# Altium integrated library SFMproject.IntLib: 182 symbols (continued)
## THVD1410DR
designator B?
3.3-V to 5-V RS-485 transceiver with +/-18-kV IEC ESD protection; Manufacturer_Name: Texas Instruments; Geometry.Height: 1.75mm; Mouser Part Number: 595-THVD1410DR; Mouser Price/Stock: https://www.mouser.co.uk/ProductDetail/Texas-Instruments/THVD1410DR?qs=chTDxNqvsylen%252BY7bN3dRQ%3D%3D; Manufacturer_Part_Number: THVD1410DR; Datasheet Link: http://www.ti.com/lit/gpn/THVD1410
footprint SOIC127P600X175-8N
pins: 1 R, 2 ~{RE}, 3 DE, 4 D, 5 GND, 6 A, 7 B, 8 VCC

## TP4056
designator U?
Complete single cell Li-Ion battery with a constant current / constant voltage linear charger; MF: NanJing Top Power ASIC Corp.; MP: TP4056; Check_prices: https://www.snapeda.com/parts/TP4056/NanJing+Top+Power+ASIC+Corp./view-part/?ref=eda; SnapEDA_Link: https://www.snapeda.com/parts/TP4056/NanJing+Top+Power+ASIC+Corp./view-part/?ref=snap; Price: None; Availability: Not in stock; Package: Package; Value: *
footprint SOP127P600X175-9N
pins: 1 TEMP (in), 2 PROG (io), 3 GND (power), 4 VCC (power), 5 BAT (out), 6 ~{STDBY} (out), 7 ~{CHRG} (out), 8 CE (in), 9 EP

## TSOP18338
designator D?  Supplier 1: Arrow Electronics  (hidden comment: TSOP18338)
Infrared Receivers Minicast AGC3 38kHz 2.5-5.5V; Manufacturer_Name: Vishay; Mouser Part Number: 78-TSOP18338; Mouser Price/Stock: https://www.mouser.co.uk/ProductDetail/Vishay-Semiconductors/TSOP1838?qs=xIYnuWu13fNltSDswXyV7w%3D%3D; Manufacturer_Part_Number: TSOP18338; Datasheet Link: *; Supplier Part Number 1: TSOP18338
footprint TSOP4856
pins: 1 OUT, 2 GND, 3 VCC

## UMH3NTN
designator Q?  Supplier 1: Digi-Key  Supplier Part Number 1: UMH3NTNCT-ND
Bipolar Transistors - Pre-Biased DUAL NPN 50V 100MA SOT-363; Manufacturer_Name: ROHM Semiconductor; Geometry.Height: 1mm; Mouser Part Number: 755-UMH3NTN; Mouser Price/Stock: https://www.mouser.co.uk/ProductDetail/ROHM-Semiconductor/UMH3NTN?qs=4kLU8WoGk0st6ahJ6z2bmw%3D%3D; Manufacturer_Part_Number: UMH3NTN; Datasheet Link: https://componentsearchengine.com/Datasheets/2/UMH3NTN.pdf
footprint UMH3NTN
pins: 1 EMITTER_1, 2 BASE_1, 3 COLLECTOR_2, 4 EMITTER_2, 5 BASE_2, 6 COLLECTOR_1

## USB4110-GF-A
designator J?  Supplier 1: Future Electronics  Supplier Part Number 1: 5117339  (hidden comment: USB4110-GF-A)
CONN USB 2.0 TYPE-C R/A SMT; Manufacturer_Name: GCT (GLOBAL CONNECTOR TECHNOLOGY); Geometry.Height: 3.26mm; Mouser Part Number: 640-USB4110-GF-A; Mouser Price/Stock: https://www.mouser.co.uk/ProductDetail/GCT/USB4110-GF-A?qs=KUoIvG%2F9IlYiZvIXQjyJeA%3D%3D; Manufacturer_Part_Number: USB4110-GF-A; Datasheet Link: https://gct.co/files/drawings/usb4110.pdf
footprint USB4110GFA
pins: A1 GND, A4 VBUS, A5 CC1, A6 D1+, A7 D1-, A8 SBU1, A9 VBUS, A12 GND, B1 GND, B4 VBUS, B5 CC2, B6 D2+, B7 D2-, B8 SBU2, B9 VBUS, B12 GND, MP1 GNG, MP2 GND, MP3 GND, MP4 GND

## USB4160-03-0170-C
designator J?
USB Connectors USB-C Rec 3u" Vert 24P SMT 1.7mm TH stakes H7.46mm T+R+Cap; Manufacturer_Name: GCT (GLOBAL CONNECTOR TECHNOLOGY); Geometry.Height: 7.66mm; Mouser Part Number: 640-USB4160-3-0170-C; Mouser Price/Stock: https://www.mouser.co.uk/ProductDetail/GCT/USB4160-03-0170-C?qs=vvQtp7zwQdMCGQNngnxScA%3D%3D; Manufacturer_Part_Number: USB4160-03-0170-C; Datasheet Link: https://gct.co/Files/Drawings/USB4160.pdf?v=75f6cea7-84cd-41d4-89e8-137dc7b10777
footprint USB4160030170C
pins: A1 GND_1, A2 SSTXP1, A3 SSTXN1, A4 VBUS_1, A5 CC1, A6 DP1, A7 DN1, A8 SBU1, A9 VBUS_2, A10 SSRXN2, A11 SSRXP2, A12 GND_2, B1 GND_3, B2 SSTXP2, B3 SSTXN2, B4 VBUS_3, B5 CC2, B6 DP2, B7 DN2, B8 SBU2, B9 VBUS_4, B10 SSRXN1, B11 SSRXP1, B12 GND_4, MH1, MH2, MH5, MH6

## VLS4012HBX-4R7M-N
designator L?
Inductor; Manufacturer_Name: TDK; Manufacturer_Part_Number: VLS4012HBX-4R7M-N; Datasheet Link: https://product.tdk.com/system/files/dam/doc/product/inductor/inductor/smd/catalog/inductor_commercial_power_vls4012hbx_en.pdf; Mouser Part Number: 810-VLS4012HBX4R7M-N; Mouser Price/Stock: https://www.mouser.co.uk/ProductDetail/TDK/VLS4012HBX-4R7M-N?qs=A6eO%252BMLsxmSUMw4Ft0GsxA%3D%3D
footprint VLS4012
pins: 1, 2

## WP115WEYW
designator D?  Supplier 1: Mouser  Supplier Part Number 1: 604-WP115WEYW
LED Bi-Color Hi-Eff. Red/Yellow 627nm/590nm 3-Pin T-1 Bulk; Manufacturer_Name: Kingbright; Geometry.Height: 7.1mm; Mouser Part Number: 604-WP115WEYW; Mouser Price/Stock: https://www.mouser.co.uk/ProductDetail/Kingbright/WP115WEYW?qs=58z0TXQGVSR6wNJCc0QydA%3D%3D; Manufacturer_Part_Number: WP115WEYW; Datasheet Link: http://www.kingbrightusa.com/images/catalog/SPEC/WP115WEYW.pdf
footprint WP115WEYW
pins: 1 A_RED, 2 COMMON_K, 3 A_YELLOW


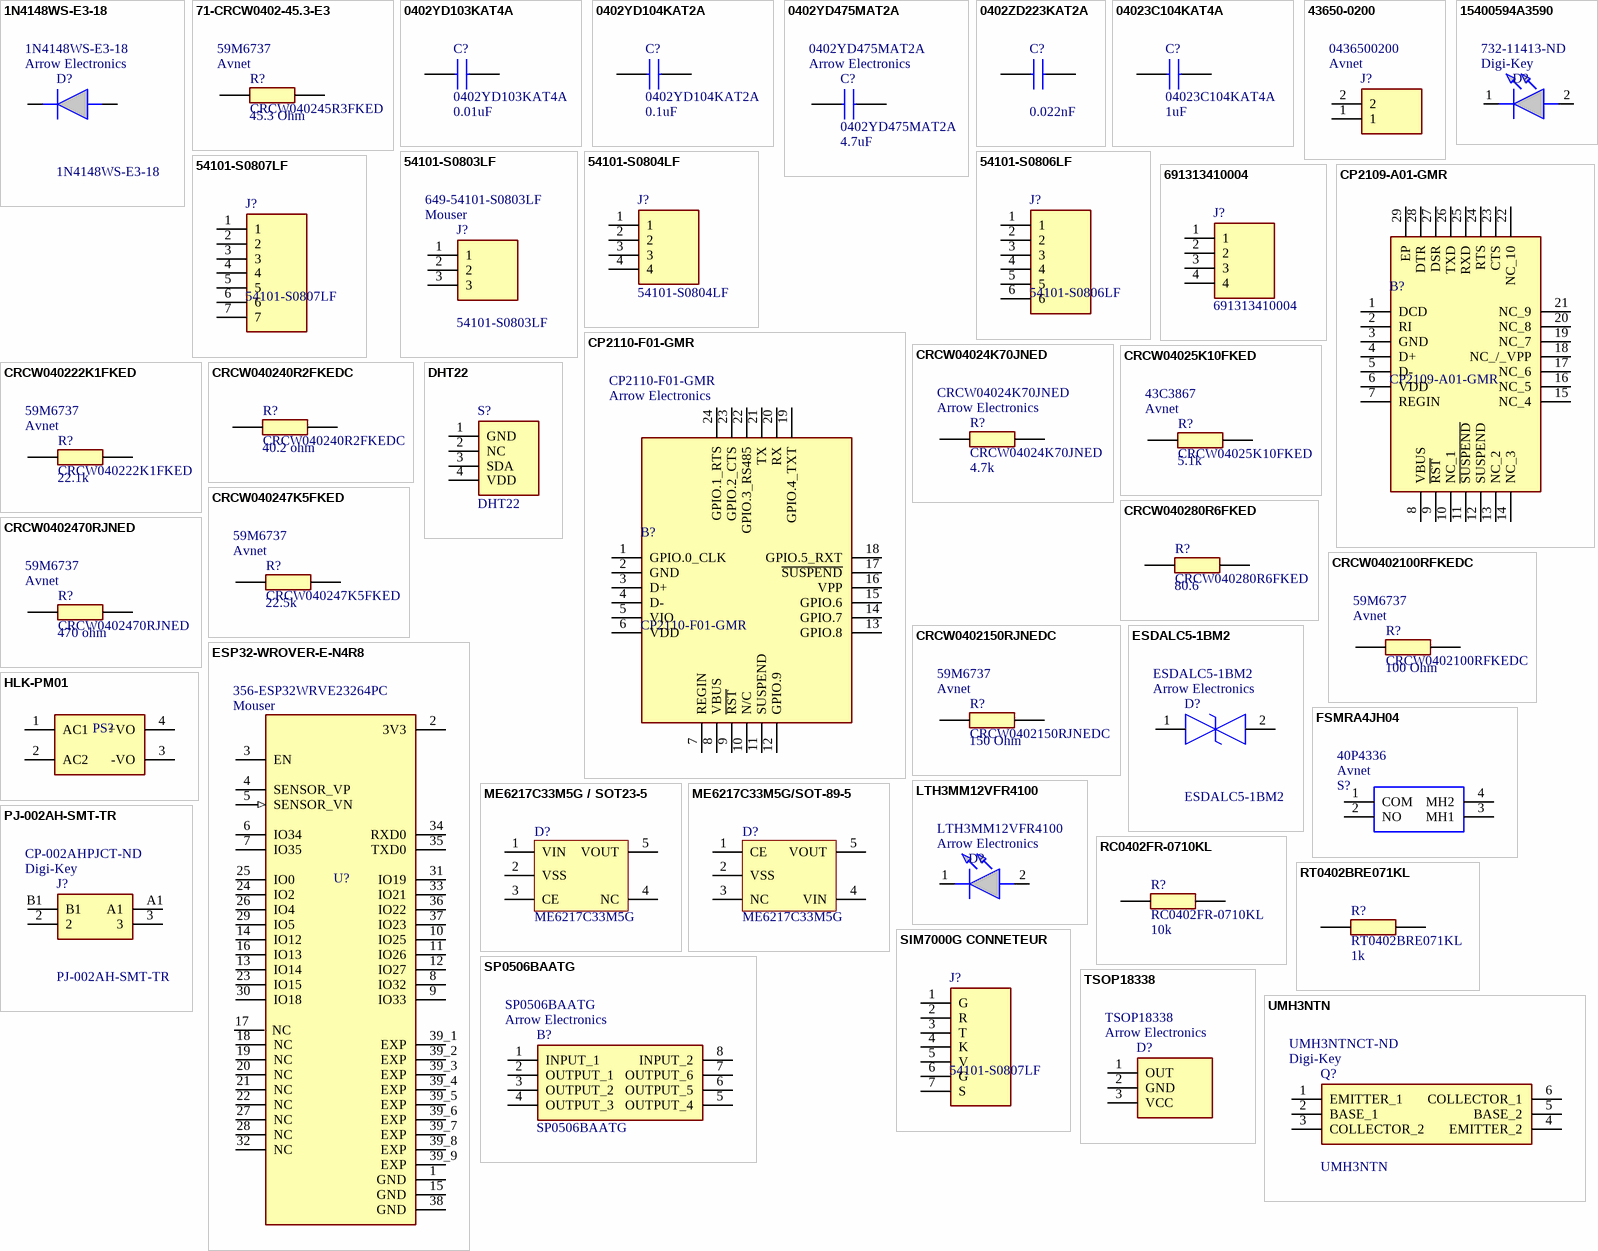
[diagram p5: symbols 1N4148WS-E3-18 to UMH3NTN]

## 1N4148WS-E3-18
designator D?  Supplier 1: Arrow Electronics
VISHAY - 1N4148WS-E3-18 - DIODE, SWITCHING, 150MA, 100V, SOD-323; Geometry.Height: 1.15mm; Mouser Part Number: 78-1N4148WS-E3-18; Mouser Price/Stock: https://www.mouser.co.uk/ProductDetail/Vishay-Semiconductors/1N4148WS-E3-18?qs=bTzheeSci6SMGZleBxLU%2Fg%3D%3D; Manufacturer_Name: Vishay; Manufacturer_Part_Number: 1N4148WS-E3-18; Datasheet Link: https://www.vishay.com/docs/85751/1n4148ws.pdf; Supplier Part Number 1: 1N4148WS-E3-18
footprint SOD2713X115N
pins: 1 K, 2 A

## 71-CRCW0402-45.3-E3
designator R?, comment CRCW040245R3FKED  value 45.3 Ohm  Supplier 1: Avnet  Supplier Part Number 1: 59M6737
Résistances à couches épaisses - CMS 1/16watt 45.3ohms 1%; Manufacturer_Name: Vishay; Geometry.Height: 0.4mm; Mouser Part Number: 71-CRCW0402-45.3-E3; Mouser Price/Stock: https://www.mouser.co.uk/ProductDetail/Vishay-Dale/CRCW04024K70JNED?qs=iWCWVRvNViwY%252BotGHUbALg%3D%3D; Manufacturer_Part_Number: CRCW040245R3FKED; Datasheet Link: http://www.vishay.com/docs/20035/dcrcwe3.pdf
footprint RESC1005X40N
pins: 1, 2

## 0402YD103KAT4A
designator C?  value 0.01uF
Multilayer Ceramic Capacitors MLCC - SMD/SMT 16V 0.01uF X7R 0402 10%; Manufacturer_Name: AVX; Manufacturer_Part_Number: 0402YC103KAT4A; Geometry.Height: 0.56mm; Mouser Part Number: 581-0402YC103KAT4A; Mouser Price/Stock: https://www.mouser.co.uk/ProductDetail/AVX/0402YD104KAT2A?qs=fS3i9m8Z%2FmrV7G1UZb6Y7g%3D%3D; Datasheet Link: *; Supplier Part Number 1: 0402YD104KAT2A; Supplier 1: Avnet
footprint CAPC1005X40N
pins: 1, 2

## 0402YD104KAT2A
designator C?  value 0.1uF
Capacitor MLCC 0402 100nF 16V AVX 0402 Standard 100nF Ceramic Multilayer Capacitor, 16 V dc, +85C, X5R Dielectric, +/-10% SMD; Geometry.Height: 0.56mm; Mouser Part Number: 581-0402YD104K; Mouser Price/Stock: https://www.mouser.co.uk/ProductDetail/AVX/0402YD104KAT2A?qs=fS3i9m8Z%2FmrV7G1UZb6Y7g%3D%3D; Manufacturer_Name: AVX; Manufacturer_Part_Number: 0402YD104KAT2A; Datasheet Link: *; Supplier Part Number 1: 0402YD104KAT2A; Supplier 1: Avnet
footprint CAPC1005X40N
pins: 1, 2

## 0402YD475MAT2A
designator C?  value 4.7uF  Supplier 1: Arrow Electronics
Multilayer Ceramic Capacitors MLCC - SMD/SMT 16V 4.7uF 20% X5R 0402; Manufacturer_Name: AVX; Geometry.Height: 0.71mm; Mouser Part Number: 581-0402YD475MAT2A; Mouser Price/Stock: https://www.mouser.co.uk/ProductDetail/AVX/0402YD475MAT2A?qs=s6nfgz3miVxwCmHE9M6tUg%3D%3D; Manufacturer_Part_Number: 0402YD475MAT2A; Datasheet Link: *; Supplier Part Number 1: 0402YD475MAT2A
footprint CAPC1005X40N
pins: 1, 2

## 0402ZD223KAT2A
designator C?  value 0.022nF  (hidden comment: 0402ZD223KAT2A)
Multilayer Ceramic Capacitors MLCC - SMD/SMT 10V 0.022uF X5R 0402 10%; Manufacturer_Name: AVX; Manufacturer_Part_Number: 0402YD104KAT2A; Geometry.Height: 0.56mm; Mouser Part Number: 581-0402ZD223KAT2A; Mouser Price/Stock: https://www.mouser.co.uk/ProductDetail/AVX/0402YD104KAT2A?qs=fS3i9m8Z%2FmrV7G1UZb6Y7g%3D%3D; Datasheet Link: *; Supplier Part Number 1: 0402YD104KAT2A; Supplier 1: Avnet
footprint CAPC1005X40N
pins: 1, 2

## 04023C104KAT4A
designator C?  value 1uF
Multilayer Ceramic Capacitors MLCC - SMD/SMT 25V .1uF X7R 0402; Manufacturer_Name: AVX; Geometry.Height: 0.56mm; Mouser Part Number: 581-04023C104KAT4A; Mouser Price/Stock: https://www.mouser.co.uk/ProductDetail/AVX/0402YD104KAT2A?qs=fS3i9m8Z%2FmrV7G1UZb6Y7g%3D%3D; Manufacturer_Part_Number: 04023C104KAT4A; Datasheet Link: *; Supplier Part Number 1: 0402YD104KAT2A; Supplier 1: Avnet
footprint CAPC1005X40N
pins: 1, 2

## 43650-0200
designator J?  Supplier 1: Avnet  Supplier Part Number 1: 0436500200  (hidden comment: 43650-0200)
Micro-Fit 3.0 Right-Angle Header, 3.00mm Pitch, Single Row, 2 Circuits, with Snap-in Plastic Peg PCB Lock, Glow-Wire Capable, Black; Manufacturer_Name: Molex; Geometry.Height: 5.57mm; Mouser Part Number: 538-43650-0200; Mouser Price/Stock: https://www.mouser.co.uk/ProductDetail/Molex/43650-0200?qs=HlEFOAM0q6XGaAJJj3Pssw%3D%3D; Manufacturer_Part_Number: 43650-0200; Datasheet Link: https://www.molex.com/pdm_docs/sd/436500200_sd.pdf
footprint 43650-02(00,01,02)
pins: 1, 2

## 54101-S0803LF
designator J?  Supplier 1: Mouser  Supplier Part Number 1: 649-54101-S0803LF
BergStik, Board to Board connector, Unshrouded vertical Header, Through Hole, Single Row, 3 Positions, 2.54 mm Pitch.; Manufacturer_Name: Amphenol Communication Solutions; Geometry.Height: 8.58mm; Mouser Part Number: 649-54101-S0803LF; Mouser Price/Stock: https://www.mouser.co.uk/ProductDetail/Amphenol-FCI/54101-S0803LF?qs=iiM6sTJtPEc921tw16XaKg%3D%3D; Manufacturer_Part_Number: 54101-S0803LF; Datasheet Link: https://cdn.amphenol-cs.com/media/wysiwyg/files/drawing/54101.pdf
footprint 54101S0803LF
pins: 1, 2, 3

## 54101-S0804LF
designator J?
BergStik, Board to Board connector, Unshrouded vertical Header, Through Hole, Single Row, 4 Positions, 2.54 mm Pitch.; Manufacturer_Name: Amphenol Communication Solutions; Geometry.Height: 8.58mm; Mouser Part Number: 649-54101-S0804LF; Mouser Price/Stock: https://www.mouser.co.uk/ProductDetail/Amphenol-FCI/54101-S0803LF?qs=iiM6sTJtPEc921tw16XaKg%3D%3D; Manufacturer_Part_Number: 54101-S0804LF; Datasheet Link: https://cdn.amphenol-cs.com/media/wysiwyg/files/drawing/54101.pdf
footprint 54101S0804LF
pins: 1, 2, 3, 4

## 54101-S0806LF
designator J?
BergStik, Board to Board connector, Unshrouded vertical Header, Through Hole, Single Row, 6 Positions, 2.54 mm Pitch.; Manufacturer_Name: Amphenol Communication Solutions; Geometry.Height: 8.58mm; Mouser Part Number: 649-54101-S0806LF; Mouser Price/Stock: https://www.mouser.co.uk/ProductDetail/Amphenol-FCI/54101-S0803LF?qs=iiM6sTJtPEc921tw16XaKg%3D%3D; Manufacturer_Part_Number: 54101-S0806LF; Datasheet Link: https://cdn.amphenol-cs.com/media/wysiwyg/files/drawing/54101.pdf
footprint 54101S0806LF
pins: 1, 2, 3, 4, 5, 6

## 54101-S0807LF
designator J?
BergStik, Board to Board connector, Unshrouded vertical Header, Through Hole, Single Row, 6 Positions, 2.54 mm Pitch.; Manufacturer_Name: Amphenol Communication Solutions; Geometry.Height: 8.58mm; Mouser Part Number: 649-54101-S0807LF; Mouser Price/Stock: https://www.mouser.co.uk/ProductDetail/Amphenol-FCI/54101-S0803LF?qs=iiM6sTJtPEc921tw16XaKg%3D%3D; Manufacturer_Part_Number: 54101-S0807LF; Datasheet Link: https://cdn.amphenol-cs.com/media/wysiwyg/files/drawing/54101.pdf
footprint 54101S0807LF
pins: 1, 2, 3, 4, 5, 6, 7

## 15400594A3590
designator D?  Supplier 1: Digi-Key  Supplier Part Number 1: 732-11413-ND  (hidden comment: 15400594A3590)
15400594A3590 Wurth Elektronik, WL-TIRW 940nm IR LED, 5 mm Through Hole package; Geometry.Height: 12.1mm; Mouser Part Number: 710-15400594A3590; Mouser Price/Stock: https://www.mouser.co.uk/ProductDetail/Wurth-Elektronik/15400594A3590?qs=5aG0NVq1C4xq5TwbX552tA%3D%3D; Manufacturer_Name: Wurth Elektronik; Manufacturer_Part_Number: 15400594A3590; Datasheet Link: https://www.we-online.com/katalog/datasheet/15400594A3590.pdf
footprint 15400594A3590
pins: 1 K, 2 A

## 691313410004
designator J?
WR-TBL Terminal block - serie 3134; Manufacturer_Name: Wurth Elektronik; Geometry.Height: 8.7mm; Mouser Part Number: 710-691313410004; Mouser Price/Stock: https://www.mouser.co.uk/ProductDetail/Wurth-Elektronik/691313410004?qs=E2PpAYvlWVthY%252BgqnT90lw%3D%3D; Manufacturer_Part_Number: 691313410004; Datasheet Link: *
footprint 691313410004
pins: 1, 2, 3, 4

## CP2109-A01-GMR
designator B?
I/O Controller Interface IC USB to UART Bridge QFN28; Manufacturer_Name: Silicon Labs; Geometry.Height: 1mm; Mouser Part Number: 634-CP2109-A01-GMR; Mouser Price/Stock: https://www.mouser.co.uk/ProductDetail/Silicon-Labs/CP2109-A01-GMR/?qs=Yyy8avaXlIsQmYePmSolcw%3D%3D; Manufacturer_Part_Number: CP2109-A01-GMR; Datasheet Link: https://www.silabs.com/documents/public/data-sheets/CP2102-9.pdf
pins: 1 DCD, 2 RI, 3 GND, 4 D+, 5 D-, 6 VDD, 7 REGIN, 8 VBUS, 9 ~{RST}, 10 NC_1, 11 ~{SUSPEND}, 12 SUSPEND, 13 NC_2, 14 NC_3, 15 NC_4, 16 NC_5, 17 NC_6, 18 NC_/_VPP, 19 NC_7, 20 NC_8, 21 NC_9, 22 NC_10, 23 CTS, 24 RTS, 25 RXD, 26 TXD, 27 DSR, 28 DTR, 29 EP

## CP2110-F01-GMR
designator B?  Supplier 1: Arrow Electronics
SILICON LABS - CP2110-F01-GMR - Interface Bridges, USB to UART, 3 V, 3.6 V, QFN, 24 Pins, -40 C; Geometry.Height: 0.8mm; Mouser Part Number: 634-CP2110-F01-GMR; Mouser Price/Stock: https://www.mouser.co.uk/ProductDetail/Silicon-Labs/CP2110-F01-GMR?qs=1CB38rTTsYoBd%2F8uYjIPcw%3D%3D; Manufacturer_Name: Silicon Labs; Manufacturer_Part_Number: CP2110-F01-GMR; Datasheet Link: https://www.silabs.com/documents/public/data-sheets/CP2110.pdf; Supplier Part Number 1: CP2110-F01-GMR
footprint QFN50P400X400X80-25N-D -2
pins: 1 GPIO.0_CLK, 2 GND, 3 D+, 4 D-, 5 VIO, 6 VDD, 7 REGIN, 8 VBUS, 9 ~{RST}, 10 N/C, 11 SUSPEND, 12 GPIO.9, 13 GPIO.8, 14 GPIO.7, 15 GPIO.6, 16 VPP, 17 ~{SUSPEND}, 18 GPIO.5_RXT, 19 GPIO.4_TXT, 20 RX, 21 TX, 22 GPIO.3_RS485, 23 GPIO.2_CTS, 24 GPIO.1_RTS

## CRCW04024K70JNED
designator R?  value 4.7k  Supplier 1: Arrow Electronics
VISHAY - CRCW04024K70JNED - RES, THICK FILM, 4K7, 5%, 0.063W, 0402; Geometry.Height: 0.4mm; Mouser Part Number: 71-CRCW0402J-4.7K-E3; Mouser Price/Stock: https://www.mouser.co.uk/ProductDetail/Vishay-Dale/CRCW04024K70JNED?qs=iWCWVRvNViwY%252BotGHUbALg%3D%3D; Manufacturer_Name: Vishay; Manufacturer_Part_Number: CRCW04024K70JNED; Datasheet Link: http://www.vishay.com/docs/20035/dcrcwe3.pdf; Supplier Part Number 1: CRCW04024K70JNED
footprint RESC1005X40N
pins: 1, 2

## CRCW04025K10FKED
designator R?  value 5.1k  Supplier 1: Avnet  Supplier Part Number 1: 43C3867
Thick Film Resistors - SMD 3/4watt 5.1Kohms 5%; Manufacturer_Name: Vishay; Geometry.Height: 0.4mm; Mouser Part Number: 71-CRCW0402-5.1K-E3; Mouser Price/Stock: https://www.mouser.co.uk/ProductDetail/Vishay-Dale/CRCW04024K70JNED?qs=iWCWVRvNViwY%252BotGHUbALg%3D%3D; Manufacturer_Part_Number: CRCW04025K10FKED; Datasheet Link: http://www.vishay.com/docs/20035/dcrcwe3.pdf
footprint RESC1005X40N
pins: 1, 2

## CRCW040222K1FKED
designator R?  value 22.1k  Supplier 1: Avnet  Supplier Part Number 1: 59M6737
Résistances à couches épaisses - CMS 1/16watt 22.1Kohms 1%; Manufacturer_Name: Vishay; Geometry.Height: 0.4mm; Mouser Part Number: 71-CRCW0402-22.1K-E3; Mouser Price/Stock: https://www.mouser.co.uk/ProductDetail/Vishay-Dale/CRCW04024K70JNED?qs=iWCWVRvNViwY%252BotGHUbALg%3D%3D; Manufacturer_Part_Number: CRCW040222K1FKED; Datasheet Link: http://www.vishay.com/docs/20035/dcrcwe3.pdf
footprint RESC1005X40N
pins: 1, 2

## CRCW040240R2FKEDC
designator R?  value 40.2 ohm
Résistances à couches épaisses - CMS 1/16watt 40.2ohms 1% Commercial Use; Manufacturer_Name: Vishay; Geometry.Height: 0.4mm; Mouser Part Number: 71-CRCW040240R2FKEDC; Mouser Price/Stock: https://www.mouser.co.uk/ProductDetail/Vishay-Dale/CRCW04024K70JNED?qs=iWCWVRvNViwY%252BotGHUbALg%3D%3D; Manufacturer_Part_Number: CRCW040240R2FKEDC; Datasheet Link: http://www.vishay.com/docs/20035/dcrcwe3.pdf; Supplier 1: Avnet; Supplier Part Number 1: 59M6737
footprint RESC1005X40N
pins: 1, 2

## CRCW040247K5FKED
designator R?  value 22.5k  Supplier 1: Avnet  Supplier Part Number 1: 59M6737
Résistances à couches épaisses - CMS 1/16watt 47.5Kohms 1%; Manufacturer_Name: Vishay; Geometry.Height: 0.4mm; Mouser Part Number: 71-CRCW0402-47.5K-E3; Mouser Price/Stock: https://www.mouser.co.uk/ProductDetail/Vishay-Dale/CRCW04024K70JNED?qs=iWCWVRvNViwY%252BotGHUbALg%3D%3D; Manufacturer_Part_Number: CRCW040247K5FKED; Datasheet Link: http://www.vishay.com/docs/20035/dcrcwe3.pdf
footprint RESC1005X40N
pins: 1, 2

## CRCW040280R6FKED
designator R?  value 80.6
Résistances à couches épaisses - CMS 1/16watt 80.6ohms 1%; Manufacturer_Name: Vishay; Geometry.Height: 0.4mm; Mouser Part Number: 71-CRCW0402-80.6-E3; Mouser Price/Stock: https://www.mouser.co.uk/ProductDetail/Vishay-Dale/CRCW04024K70JNED?qs=iWCWVRvNViwY%252BotGHUbALg%3D%3D; Manufacturer_Part_Number: CRCW040280R6FKED; Datasheet Link: http://www.vishay.com/docs/20035/dcrcwe3.pdf; Supplier 1: Avnet; Supplier Part Number 1: 59M6737
footprint RESC1005X40N
pins: 1, 2

## CRCW0402100RFKEDC
designator R?  value 100 Ohm  Supplier 1: Avnet  Supplier Part Number 1: 59M6737
Résistances à couches épaisses - CMS 1/16watt 100ohms 1% Commercial Use; Manufacturer_Name: Vishay; Geometry.Height: 0.4mm; Mouser Part Number: 71-CRCW0402100RFKEDC; Mouser Price/Stock: https://www.mouser.co.uk/ProductDetail/Vishay-Dale/CRCW04024K70JNED?qs=iWCWVRvNViwY%252BotGHUbALg%3D%3D; Manufacturer_Part_Number: CRCW0402100RFKEDC; Datasheet Link: http://www.vishay.com/docs/20035/dcrcwe3.pdf
footprint RESC1005X40N
pins: 1, 2

## CRCW0402150RJNEDC
designator R?  value 150 Ohm  Supplier 1: Avnet  Supplier Part Number 1: 59M6737
Thick Film Resistors - SMD 1/16watt 150ohms 5%; Manufacturer_Name: Vishay; Geometry.Height: 0.4mm; Mouser Part Number: 71-CRCW0402150RJNEDC; Mouser Price/Stock: https://www.mouser.co.uk/ProductDetail/Vishay-Dale/CRCW04024K70JNED?qs=iWCWVRvNViwY%252BotGHUbALg%3D%3D; Manufacturer_Part_Number: CRCW0402150RJNEDC; Datasheet Link: http://www.vishay.com/docs/20035/dcrcwe3.pdf
footprint RESC1005X40N
pins: 1, 2

## CRCW0402470RJNED
designator R?  value 470 ohm  Supplier 1: Avnet  Supplier Part Number 1: 59M6737
Thick Film Resistors - SMD 1/16watt 470ohms 5%; Manufacturer_Name: Vishay; Geometry.Height: 0.4mm; Mouser Part Number: 71-CRCW0402J-470-E3; Mouser Price/Stock: https://www.mouser.co.uk/ProductDetail/Vishay-Dale/CRCW04024K70JNED?qs=iWCWVRvNViwY%252BotGHUbALg%3D%3D; Manufacturer_Part_Number: CRCW0402470RJNED; Datasheet Link: http://www.vishay.com/docs/20035/dcrcwe3.pdf
footprint RESC1005X40N
pins: 1, 2

## DHT22
designator S?
DHT22 Temp / Humidity Sensor; Manufacturer_Name: Amphenol Communication Solutions; Manufacturer_Part_Number: 83-17985; Geometry.Height: 8.58mm; Mouser Part Number: 83-17985; Mouser Price/Stock: https://www.mouser.co.uk/ProductDetail/Amphenol-FCI/54101-S0803LF?qs=iiM6sTJtPEc921tw16XaKg%3D%3D; Datasheet Link: https://cdn.amphenol-cs.com/media/wysiwyg/files/drawing/54101.pdf
footprint dht22
pins: 1 GND, 2 NC, 3 SDA, 4 VDD

## ESDALC5-1BM2
designator D?  Supplier 1: Arrow Electronics
Clamp - Ipp Tvs Diode Surface Mount SOD-882, 5V, 150W, -55C~150C; Manufacturer_Name: STMicroelectronics; Geometry.Height: 0.5mm; Mouser Part Number: 511-ESDALC5-1BM2; Mouser Price/Stock: https://www.mouser.co.uk/ProductDetail/STMicroelectronics/ESDALC5-1BM2?qs=z0iXaKah%2FHD83bi3LWB72A%3D%3D; Manufacturer_Part_Number: ESDALC5-1BM2; Datasheet Link: https://www.st.com/resource/en/datasheet/esdalc5-1bm2.pdf; Supplier Part Number 1: ESDALC5-1BM2
footprint ESDALC51BM2
pins: 1, 2

## ESP32-WROVER-E-N4R8
designator U?  Supplier 1: Mouser  Supplier Part Number 1: 356-ESP32WRVE23264PC
Bluetooth, WiFi 802.11b/g/n, Bluetooth v4.2 +EDR Transceiver Module 2.4GHz ~ 2.5GHz PCB Trace Surface Mount; MF: Espressif Systems; MP: ESP32WROVEREN4R8; SnapEDA_Link: https://www.snapeda.com/parts/ESP32WROVEREN4R8/Espressif+Systems/view-part/?ref=snap; Price: None; Check_prices: https://www.snapeda.com/parts/ESP32WROVEREN4R8/Espressif+Systems/view-part/?ref=eda; Value: *; Package: None; Availability: In Stock; Purchase-URL: https://pricing.snapeda.com/search/part/ESP32WROVEREN4R8/?ref=eda
footprint XCVR_ESP32-WROVER-E-N4R8
pins: 1 GND (power), 2 3V3 (power), 3 EN, 4 SENSOR_VP, 5 SENSOR_VN (in), 6 IO34, 7 IO35, 8 IO32, 9 IO33, 10 IO25, 11 IO26, 12 IO27, 13 IO14, 14 IO12, 15 GND (power), 16 IO13, 17 NC, 18 NC, 19 NC, 20 NC, 21 NC, 22 NC, 23 IO15, 24 IO2, 25 IO0, 26 IO4, 27 NC, 28 NC, 29 IO5, 30 IO18, 31 IO19, 32 NC, 33 IO21, 34 RXD0, 35 TXD0, 36 IO22, 37 IO23, 38 GND (power), 39_1 EXP (power), 39_2 EXP (power), 39_3 EXP (power), 39_4 EXP (power), 39_5 EXP (power), 39_6 EXP (power), 39_7 EXP (power), 39_8 EXP (power), 39_9 EXP (power)

## FSMRA4JH04
designator S?  Supplier 1: Avnet  Supplier Part Number 1: 40P4336  (hidden comment: *)
Switch, Pushbutton, Tactile, Single Pole, 50mA, Right Angle; MP: FSMRA4JH04; MF: TE Connectivity; Package: None; Purchase-URL: https://pricing.snapeda.com/search/part/FSMRA4JH04/?ref=eda; Check_prices: https://www.snapeda.com/parts/FSMRA4JH04/TE%20Connectivity/view-part/45679/?ref=eda; Availability: Good; Price: None; SnapEDA_Link: https://www.snapeda.com/parts/FSMRA4JH04/TE%20Connectivity/view-part/45679/?ref=snap; Value: *
footprint FSMRA4JH04
pins: 1 COM, 2 NO, 3 MH1, 4 MH2

## HLK-PM01
designator PS?  (value not drawn)
The HLK-PM01 is a small size low cost AC to DC converter which can take in 110V/220V AC at 50/60 Hz and give 5V 3W output. The module is can be used in designs which run on 5V and needs to be powered form the AC mains.; MF: Hi-link; Package: None; Value: *; Price: None; Check_prices: https://www.snapeda.com/parts/hlk-pm01/Hi-link/view-part/?ref=eda; MP: hlk-pm01; Availability: Not in stock; SnapEDA_Link: https://www.snapeda.com/parts/hlk-pm01/Hi-link/view-part/?ref=snap
footprint CONV_HLK-PM01
pins: 1 AC1, 2 AC2, 3 -VO, 4 +VO

## LTH3MM12VFR4100
designator D?  Supplier 1: Arrow Electronics  (hidden comment: LTH3MM12VFR4100)
Standard LEDs - Through Hole 3mm Thru Hole LED 625nm for 12VDC; Manufacturer_Name: Visual Communications Company; Geometry.Height: 6.3mm; Mouser Part Number: 593-LTH3MM12VFR4100; Mouser Price/Stock: https://www.mouser.co.uk/ProductDetail/VCC/LTH3MM12VFR4100?qs=Mv7BduZupUhznjtoVCBbVQ%3D%3D; Manufacturer_Part_Number: LTH3MM12VFR4100; Datasheet Link: https://vcclite.com/wp-content/uploads/wpallimport/files/files/LTH3MM12VFR4100.pdf; Supplier Part Number 1: LTH3MM12VFR4100
footprint LTH3MM12VFR4100
pins: 1 K, 2 A

## ME6217C33M5G / SOT23-5
designator D?, comment ME6217C33M5G
footprint SOT-23-5_L2.9-W1.6-P0.95-LS2.8-BR
pins: 1 VIN, 2 VSS, 3 CE, 4 NC, 5 VOUT

## ME6217C33M5G/SOT-89-5
designator D?, comment ME6217C33M5G
footprint SOT89-150P410X160-5N (SOT89, 3-Leads, Body 4.50x2.45mm, Pitch 1.50mm, Lead Span 4.1mm, IPC Medium Density)
pins: 1 CE, 2 VSS, 3 NC, 4 VIN, 5 VOUT

## PJ-002AH-SMT-TR
designator J?  Supplier 1: Digi-Key  Supplier Part Number 1: CP-002AHPJCT-ND
DC Power Connectors Power Jacks; Manufacturer_Name: CUI Devices; Geometry.Height: 11.23mm; Mouser Part Number: 490-PJ-002AH-SMT-TR; Mouser Price/Stock: https://www.mouser.co.uk/ProductDetail/CUI-Devices/PJ-002AH-SMT-TR?qs=WyjlAZoYn52i5LSWfoFS9w%3D%3D; Manufacturer_Part_Number: PJ-002AH-SMT-TR; Datasheet Link: https://www.cuidevices.com/product/resource/pj-002ah-smt-tr.pdf
footprint PJ002AHSMTTR
pins: 2, 3, A1, B1

## RC0402FR-0710KL
designator R?  value 10k
Yageo 10k, 0402 (1005M) Thick Film SMD Resistor +/-1% 0.063W - RC0402FR-0710KL; Geometry.Height: 0.4mm; Mouser Part Number: 603-RC0402FR-0710KL; Mouser Price/Stock: https://www.mouser.co.uk/ProductDetail/YAGEO/RC0402FR-0710KL?qs=I1mnnYJTTsxUoNwrUsQExA%3D%3D; Manufacturer_Name: YAGEO; Manufacturer_Part_Number: RC0402FR-0710KL; Datasheet Link: https://componentsearchengine.com/Datasheets/2/RC0402FR-0710KL.pdf; Supplier Part Number 1: 7468275; Supplier 1: Future Electronics
footprint RESC1005X40N
pins: 1, 2

## RT0402BRE071KL
designator R?  value 1k
Thin Film Resistors - SMD 1/16W 1K ohm .1% 50ppm; Manufacturer_Name: YAGEO; Geometry.Height: 0.4mm; Mouser Part Number: 603-RT0402BRE071KL; Mouser Price/Stock: https://www.mouser.co.uk/ProductDetail/YAGEO/RC0402FR-0710KL?qs=I1mnnYJTTsxUoNwrUsQExA%3D%3D; Manufacturer_Part_Number: RT0402BRE071KL; Datasheet Link: https://componentsearchengine.com/Datasheets/2/RC0402FR-0710KL.pdf; Supplier 1: Future Electronics; Supplier Part Number 1: 3025706
footprint RESC1005X40N
pins: 1, 2

## SIM7000G CONNETEUR
designator J?, comment 54101-S0807LF
BergStik, Board to Board connector, Unshrouded vertical Header, Through Hole, Single Row, 6 Positions, 2.54 mm Pitch.; Manufacturer_Name: Amphenol Communication Solutions; Geometry.Height: 8.58mm; Mouser Part Number: 649-54101-S0807LF; Mouser Price/Stock: https://www.mouser.co.uk/ProductDetail/Amphenol-FCI/54101-S0803LF?qs=iiM6sTJtPEc921tw16XaKg%3D%3D; Manufacturer_Part_Number: 54101-S0807LF; Datasheet Link: https://cdn.amphenol-cs.com/media/wysiwyg/files/drawing/54101.pdf
footprint 54101S0807LF
pins: 1 G, 2 R, 3 T, 4 K, 5 V, 6 G, 7 S

## SP0506BAATG
designator B?  Supplier 1: Arrow Electronics
TVS Diode Arrays; Manufacturer_Name: LITTELFUSE; Geometry.Height: 1.17mm; Mouser Part Number: 576-SP0506BAATG; Mouser Price/Stock: https://www.mouser.co.uk/ProductDetail/Littelfuse/SP0506BAATG?qs=RnOBYWd%2Fz7c6KTUitxDieg%3D%3D; Manufacturer_Part_Number: SP0506BAATG; Datasheet Link: https://www.littelfuse.com/~/media/electronics/datasheets/tvs_diode_arrays/littelfuse_tvs_diode_array_sp05_datasheet.pdf.pdf; Supplier Part Number 1: SP0506BAATG
footprint SOP65P488X117-8N
pins: 1 INPUT_1, 2 OUTPUT_1, 3 OUTPUT_2, 4 OUTPUT_3, 5 OUTPUT_4, 6 OUTPUT_5, 7 OUTPUT_6, 8 INPUT_2

## TSOP18338
designator D?  Supplier 1: Arrow Electronics  (hidden comment: TSOP18338)
Infrared Receivers Minicast AGC3 38kHz 2.5-5.5V; Manufacturer_Name: Vishay; Mouser Part Number: 78-TSOP18338; Mouser Price/Stock: https://www.mouser.co.uk/ProductDetail/Vishay-Semiconductors/TSOP1838?qs=xIYnuWu13fNltSDswXyV7w%3D%3D; Manufacturer_Part_Number: TSOP18338; Datasheet Link: *; Supplier Part Number 1: TSOP18338
footprint TSOP4856
pins: 1 OUT, 2 GND, 3 VCC

## UMH3NTN
designator Q?  Supplier 1: Digi-Key  Supplier Part Number 1: UMH3NTNCT-ND
Bipolar Transistors - Pre-Biased DUAL NPN 50V 100MA SOT-363; Manufacturer_Name: ROHM Semiconductor; Geometry.Height: 1mm; Mouser Part Number: 755-UMH3NTN; Mouser Price/Stock: https://www.mouser.co.uk/ProductDetail/ROHM-Semiconductor/UMH3NTN?qs=4kLU8WoGk0st6ahJ6z2bmw%3D%3D; Manufacturer_Part_Number: UMH3NTN; Datasheet Link: https://componentsearchengine.com/Datasheets/2/UMH3NTN.pdf
footprint UMH3NTN
pins: 1 EMITTER_1, 2 BASE_1, 3 COLLECTOR_2, 4 EMITTER_2, 5 BASE_2, 6 COLLECTOR_1

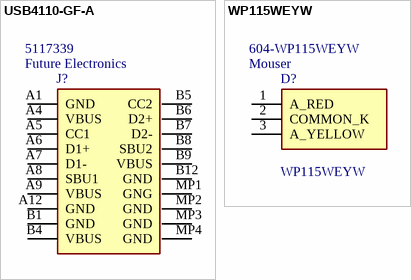
[diagram p6: symbols USB4110-GF-A to WP115WEYW]

## USB4110-GF-A
designator J?  Supplier 1: Future Electronics  Supplier Part Number 1: 5117339  (hidden comment: USB4110-GF-A)
CONN USB 2.0 TYPE-C R/A SMT; Manufacturer_Name: GCT (GLOBAL CONNECTOR TECHNOLOGY); Geometry.Height: 3.26mm; Mouser Part Number: 640-USB4110-GF-A; Mouser Price/Stock: https://www.mouser.co.uk/ProductDetail/GCT/USB4110-GF-A?qs=KUoIvG%2F9IlYiZvIXQjyJeA%3D%3D; Manufacturer_Part_Number: USB4110-GF-A; Datasheet Link: https://gct.co/files/drawings/usb4110.pdf
footprint USB4110GFA
pins: A1 GND, A4 VBUS, A5 CC1, A6 D1+, A7 D1-, A8 SBU1, A9 VBUS, A12 GND, B1 GND, B4 VBUS, B5 CC2, B6 D2+, B7 D2-, B8 SBU2, B9 VBUS, B12 GND, MP1 GNG, MP2 GND, MP3 GND, MP4 GND

## WP115WEYW
designator D?  Supplier 1: Mouser  Supplier Part Number 1: 604-WP115WEYW
LED Bi-Color Hi-Eff. Red/Yellow 627nm/590nm 3-Pin T-1 Bulk; Manufacturer_Name: Kingbright; Geometry.Height: 7.1mm; Mouser Part Number: 604-WP115WEYW; Mouser Price/Stock: https://www.mouser.co.uk/ProductDetail/Kingbright/WP115WEYW?qs=58z0TXQGVSR6wNJCc0QydA%3D%3D; Manufacturer_Part_Number: WP115WEYW; Datasheet Link: http://www.kingbrightusa.com/images/catalog/SPEC/WP115WEYW.pdf
footprint WP115WEYW
pins: 1 A_RED, 2 COMMON_K, 3 A_YELLOW